# Altium footprint library RDM_ALT_PCB.PcbLib: 171 footprints (part 7 of 11)
Each footprint in its own frame and in the unit in brackets; x right, y up, seen from the top. Pads: shape width x height; smd on the part's side, far side on the other; paste and mask are expansions set on the pad; w line width, h text height; cw(c..) or ccw(c..) is an arc to the next point about the centre after c.
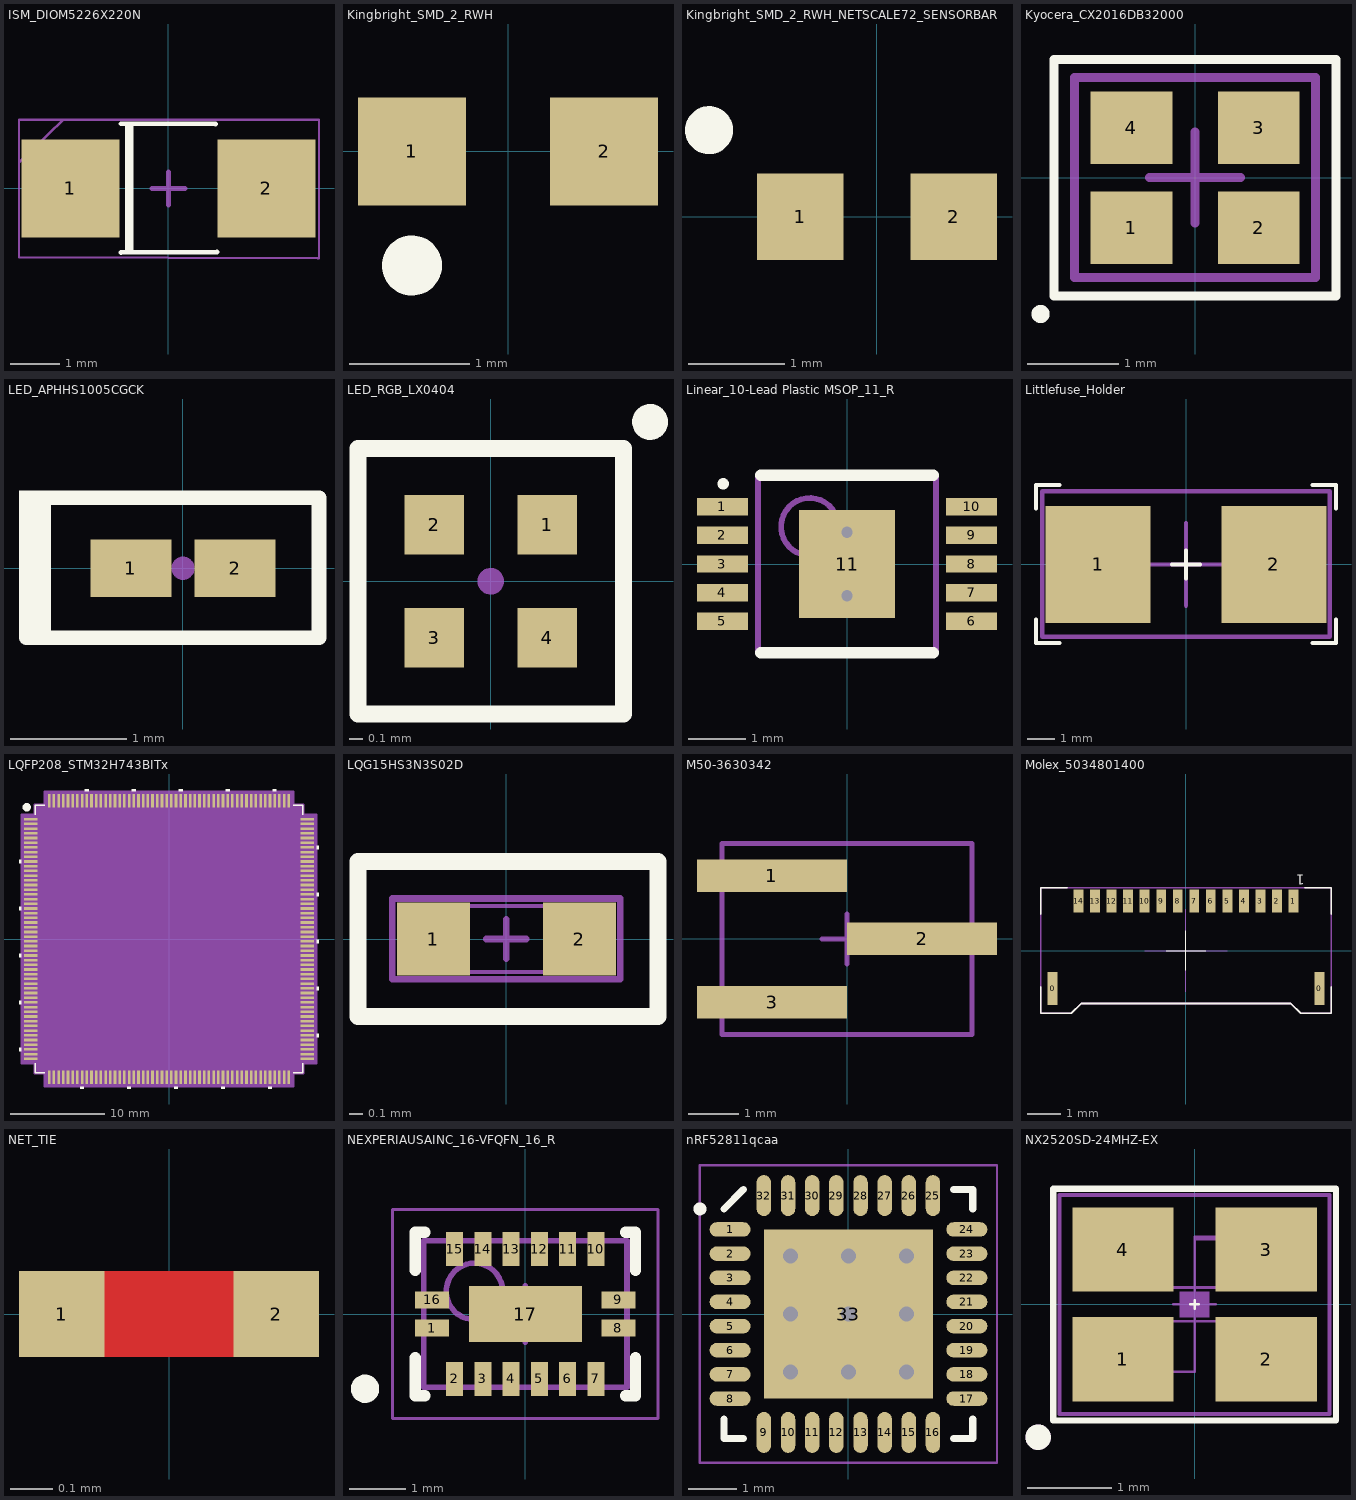
[diagram p6: the footprints below, top view; thin cyan lines are the x and y axes]

## ISM_DIOM5226X220N [mm]
pads (2):
  rect 2x2 smd: 1(-2,0) 2(2,0)
Top Overlay:
  rectangle: -0.889,-1.321 -0.711,1.321
  lines w0.1: -0.965,-1.309 0.991,-1.295 ; -0.965,1.321 0.965,1.314
Mechanical 13:
  lines w0.1: -0.337,0 0.337,0 ; 0,-0.337 0,0.337
Mechanical 15:
  lines w0.05: -3.05,-1.41 3.05,-1.425 ; -3.05,-1.4 -3.05,1.4 3.075,1.4 ; -3.041,0.541 -2.15,1.4 ; -0.337,0 0.337,0 ; 0,-0.337 0,0.337 ; 3.075,-1.425 3.075,1.375
3D body "1SMA5.0AT3G.stp": height 2.2, standoff 0, extent -2.605,-1.302 2.605,1.303

## Kingbright_SMD_2_RWH [mm] "Kingbright_SMD_2_RWH"
height 0.6
pads (2):
  rect 0.9x0.9 smd: 1(-0.8,0) 2(0.8,0)
Top Overlay:
  circle w0.25: c-0.8,-0.95 r0.125
3D body "APA1606.STEP": height 0.6, standoff 0, extent -0.801,-0.301 0.8,0.9

## Kingbright_SMD_2_RWH_NETSCALE72_SENSORBAR [mm] "Kingbright_SMD_2_RWH"
height 0.6
pads (2):
  rect 0.9x0.9 smd: 1(-0.8,0) 2(0.8,0)
Top Overlay:
  circle w0.25: c-1.75,0.9 r0.125
3D body "APA1606.STEP": height 0.6, standoff 0, extent -0.801,-0.301 0.8,0.9

## Kyocera_CX2016DB32000 [mm] "CRYSTAL 32.0000MHZ 8PF SMD"
pads (4):
  rect 0.9x0.8 smd: 1(-0.7,-0.55) 2(0.7,-0.55) 3(0.7,0.55) 4(-0.7,0.55)
Top Overlay:
  circle w0.1: c-1.7,-1.5 r0.05
  lines w0.1: -1.55,-1.3 1.55,-1.3 1.55,1.3 -1.55,1.3 -1.55,-1.3
Mechanical 13:
  lines w0.1: -1.325,-1.1 1.325,-1.1 1.325,1.1 -1.325,1.1 -1.325,-1.1
Mechanical 15:
  lines w0.05: -1.55,-1.3 1.55,-1.3 1.55,1.3 -1.55,1.3 -1.55,-1.3
  lines w0.1: -0.5,0 0.5,0 ; 0,-0.5 0,0.5
3D body: height 0.01, standoff -0.05, extent -1.05,-0.85 -0.475,-0.325
3D body: height 0.01, standoff -0.05, extent 0.475,-0.85 1.05,-0.317
3D body: height 0.01, standoff -0.05, extent 0.475,0.325 1.05,0.85
3D body: height 0.01, standoff -0.05, extent -1.05,0.325 -0.475,0.85
3D body: height 0.45, standoff 0, extent -1.15,-0.95 1.15,0.95
3D body: height 0.6, standoff -0.6, extent 0.375,-1.4 0.375,-1.4

## LED_APHHS1005CGCK [mm] "LED_CHIP_0402"
height 0.6
pads (2):
  rect 0.7x0.5 smd: 1(-0.45,0) 2(0.45,0)
Top Overlay:
  rectangle: -1.416,-0.6 -1.141,0.673
  lines w0.127: -1.351,-0.6 -1.351,0.61 1.175,0.61 1.175,-0.6 -1.351,-0.6
Mechanical 15:
  circle w0.1: c0,0 r0.05
  lines w0.1: -1.26,-0.6 -1.26,0.6 1.175,0.6 1.175,-0.6 -1.26,-0.6
3D body "User Library-LED_1006_G.STEP": height 0.2, standoff 0, extent -0.5,-0.3 0.5,0.3

## LED_RGB_LX0404 [mm] "LED RGB CLEAR SMD"
height 0.25
pads (4):
  rect 0.45x0.45 smd: 1(0.425,0.425) 2(-0.425,0.425) 3(-0.425,-0.425) 4(0.425,-0.425)
Top Overlay:
  circle w0.15: c1.2,1.2 r0.06
  lines w0.127: -1,-1 1,-1 1,1 -1,1 -1,-1
Mechanical 15:
  circle w0.1: c0,0 r0.05
  lines w0.1: -1,-1 -1,1 1,1 1,-1 -1,-1
3D body: height 0.26, standoff 0, extent -0.128,-0.333 0.128,0.333
3D body: height 0.25, standoff 0, extent -0.8,-0.8 0.8,0.8
3D body: height 0.26, standoff 0, extent 0.297,-0.333 0.553,0.333
3D body: height 0.26, standoff 0, extent -0.553,-0.333 -0.297,0.333

## Linear_10-Lead Plastic MSOP_11_R [mm] "Linear_10-Lead Plastic MSOP_11_R"
height 1.1
pads (11):
  rect 0.889x0.305 smd mask+0.082: 1(-2.171,1) 2(-2.171,0.5) 3(-2.171,0) 4(-2.171,-0.5) 5(-2.171,-1) 6(2.171,-1) 7(2.171,-0.5) 8(2.171,0) 9(2.171,0.5) 10(2.171,1)
  rect 1.68x1.88 smd mask+0.082: 11(0,0)
via 0,0.55 diameter 0.5 hole 0.2
via 0,-0.55 diameter 0.5 hole 0.2
Top Overlay:
  circle w0.2: c-2.159,1.397 r0
  lines w0.2: -1.5,-1.55 1.5,-1.55 ; -1.5,1.55 1.5,1.55
Mechanical 13:
  circle w0.1: c-0.65,0.65 r0.5
  lines w0.1: -1.55,-1.55 -1.55,1.55 1.55,1.55 1.55,-1.55 -1.55,-1.55
3D body: height 1.1, standoff 0.05, extent -1.55,-1.55 1.55,1.55

## Littlefuse_Holder [mm] "SMD  Fuse Board 375mA 125VAC/VDC"
pads (2):
  rect 3.81x4.24 smd: 1(-3.19,0) 2(3.19,0)
Top Overlay:
  lines w0.15: -5.446,-2.007 -5.446,-2.858 -4.595,-2.858 ; -5.446,2.034 -5.446,2.885 -4.595,2.885 ; -0.508,0 0.508,0 ; 0,-0.508 0,0.508 ; 4.595,-2.858 5.446,-2.858 5.446,-2.007 ; 4.595,2.885 5.446,2.885 5.446,2.034
Mechanical 15:
  lines w0.15: -1.5,0 1.5,0 ; 0,-1.5 0,1.5 ; -5.217,-2.629 5.217,-2.629 5.217,2.656 -5.217,2.656 -5.217,-2.629
3D body "Littlefuse_with_catridge_3D.STEP": height 3.81, standoff 0, extent -4.865,-2.515 4.865,2.515

## LQFP208_STM32H743BITx [mil]
pads (208):
  rect 58x11 smd: 1(-579.5,501.97) 2(-579.5,482.28) 3(-579.5,462.6) 4(-579.5,442.91) 5(-579.5,423.23) 6(-579.5,403.54) 7(-579.5,383.86) 8(-579.5,364.17) 9(-579.5,344.49) 10(-579.5,324.8) 11(-579.5,305.12) 12(-579.5,285.43) 13(-579.5,265.75) 14(-579.5,246.06) 15(-579.5,226.38) 16(-579.5,206.69) 17(-579.5,187.01) 18(-579.5,167.32) 19(-579.5,147.64) 20(-579.5,127.95) 21(-579.5,108.27) 22(-579.5,88.58) 23(-579.5,68.9) 24(-579.5,49.21) 25(-579.5,29.53) 26(-579.5,9.84) 27(-579.5,-9.84) 28(-579.5,-29.53) 29(-579.5,-49.21) 30(-579.5,-68.9) 31(-579.5,-88.58) 32(-579.5,-108.27) 33(-579.5,-127.95) 34(-579.5,-147.64) 35(-579.5,-167.32) 36(-579.5,-187.01) 37(-579.5,-206.69) 38(-579.5,-226.38) 39(-579.5,-246.06) 40(-579.5,-265.75) 41(-579.5,-285.43) 42(-579.5,-305.12) 43(-579.5,-324.8) 44(-579.5,-344.49) 45(-579.5,-364.17) 46(-579.5,-383.86) 47(-579.5,-403.54) 48(-579.5,-423.23) 49(-579.5,-442.91) 50(-579.5,-462.6) 51(-579.5,-482.28) 52(-579.5,-501.97) 105(579.5,-501.97) 106(579.5,-482.28) 107(579.5,-462.6) 108(579.5,-442.91) 109(579.5,-423.23) 110(579.5,-403.54) 111(579.5,-383.86) 112(579.5,-364.17) 113(579.5,-344.49) 114(579.5,-324.8) 115(579.5,-305.12) 116(579.5,-285.43) 117(579.5,-265.75) 118(579.5,-246.06) 119(579.5,-226.38) 120(579.5,-206.69) 121(579.5,-187.01) 122(579.5,-167.32) 123(579.5,-147.64) 124(579.5,-127.95) 125(579.5,-108.27) 126(579.5,-88.58) 127(579.5,-68.9) 128(579.5,-49.21) 129(579.5,-29.53) 130(579.5,-9.84) 131(579.5,9.84) 132(579.5,29.53) 133(579.5,49.21) 134(579.5,68.9) 135(579.5,88.58) 136(579.5,108.27) 137(579.5,127.95) 138(579.5,147.64) 139(579.5,167.32) 140(579.5,187.01) 141(579.5,206.69) 142(579.5,226.38) 143(579.5,246.06) 144(579.5,265.75) 145(579.5,285.43) 146(579.5,305.12) 147(579.5,324.8) 148(579.5,344.49) 149(579.5,364.17) 150(579.5,383.86) 151(579.5,403.54) 152(579.5,423.23) 153(579.5,442.91) 154(579.5,462.6) 155(579.5,482.28) 156(579.5,501.97)
  rect 11x58 smd: 53(-501.97,-579.5) 54(-482.28,-579.5) 55(-462.6,-579.5) 56(-442.91,-579.5) 57(-423.23,-579.5) 58(-403.54,-579.5) 59(-383.86,-579.5) 60(-364.17,-579.5) 61(-344.49,-579.5) 62(-324.8,-579.5) 63(-305.12,-579.5) 64(-285.43,-579.5) 65(-265.75,-579.5) 66(-246.06,-579.5) 67(-226.38,-579.5) 68(-206.69,-579.5) 69(-187.01,-579.5) 70(-167.32,-579.5) 71(-147.64,-579.5) 72(-127.95,-579.5) 73(-108.27,-579.5) 74(-88.58,-579.5) 75(-68.9,-579.5) 76(-49.21,-579.5) 77(-29.53,-579.5) 78(-9.84,-579.5) 79(9.84,-579.5) 80(29.53,-579.5) 81(49.21,-579.5) 82(68.9,-579.5) 83(88.58,-579.5) 84(108.27,-579.5) 85(127.95,-579.5) 86(147.64,-579.5) 87(167.32,-579.5) 88(187.01,-579.5) 89(206.69,-579.5) 90(226.38,-579.5) 91(246.06,-579.5) 92(265.75,-579.5) 93(285.43,-579.5) 94(305.12,-579.5) 95(324.8,-579.5) 96(344.49,-579.5) 97(364.17,-579.5) 98(383.86,-579.5) 99(403.54,-579.5) 100(423.23,-579.5) 101(442.91,-579.5) 102(462.6,-579.5) 103(482.28,-579.5) 104(501.97,-579.5) 157(501.97,579.5) 158(482.28,579.5) 159(462.6,579.5) 160(442.91,579.5) 161(423.23,579.5) 162(403.54,579.5) 163(383.86,579.5) 164(364.17,579.5) 165(344.49,579.5) 166(324.8,579.5) 167(305.12,579.5) 168(285.43,579.5) 169(265.75,579.5) 170(246.06,579.5) 171(226.38,579.5) 172(206.69,579.5) 173(187.01,579.5) 174(167.32,579.5) 175(147.64,579.5) 176(127.95,579.5) 177(108.27,579.5) 178(88.58,579.5) 179(68.9,579.5) 180(49.21,579.5) 181(29.53,579.5) 182(9.84,579.5) 183(-9.84,579.5) 184(-29.53,579.5) 185(-49.21,579.5) 186(-68.9,579.5) 187(-88.58,579.5) 188(-108.27,579.5) 189(-127.95,579.5) 190(-147.64,579.5) 191(-167.32,579.5) 192(-187.01,579.5) 193(-206.69,579.5) 194(-226.38,579.5) 195(-246.06,579.5) 196(-265.75,579.5) 197(-285.43,579.5) 198(-305.12,579.5) 199(-324.8,579.5) 200(-344.49,579.5) 201(-364.17,579.5) 202(-383.86,579.5) 203(-403.54,579.5) 204(-423.23,579.5) 205(-442.91,579.5) 206(-462.6,579.5) 207(-482.28,579.5) 208(-501.97,579.5)
Top Overlay:
  circle w19.68: c-596,552 r7.87
  region: -336.99,618.5 -351.99,618.5 -351.99,628.5 -336.99,628.5
  region: -140.14,618.5 -155.14,618.5 -155.14,628.5 -140.14,628.5
  region: 56.71,618.5 41.71,618.5 41.71,628.5 56.71,628.5
  region: 253.56,618.5 238.56,618.5 238.56,628.5 253.56,628.5
  region: 450.41,618.5 435.41,618.5 435.41,628.5 450.41,628.5
  region: 618.5,391.36 628.5,391.36 628.5,376.36 618.5,376.36
  region: 618.5,194.51 628.5,194.51 628.5,179.51 618.5,179.51
  region: 618.5,-2.34 628.5,-2.34 628.5,-17.34 618.5,-17.34
  region: 618.5,-199.19 628.5,-199.19 628.5,-214.19 618.5,-214.19
  region: 618.5,-396.04 628.5,-396.04 628.5,-411.04 618.5,-411.04
  region: 430.73,-618.5 415.73,-618.5 415.73,-628.5 430.73,-628.5
  region: 233.88,-618.5 218.88,-618.5 218.88,-628.5 233.88,-628.5
  region: 37.03,-618.5 22.03,-618.5 22.03,-628.5 37.03,-628.5
  region: -159.82,-618.5 -174.82,-618.5 -174.82,-628.5 -159.82,-628.5
  region: -356.67,-618.5 -371.67,-618.5 -371.67,-628.5 -356.67,-628.5
  region: -618.5,-455.1 -628.5,-455.1 -628.5,-470.1 -618.5,-470.1
  region: -618.5,-258.25 -628.5,-258.25 -628.5,-273.25 -618.5,-273.25
  region: -618.5,-61.4 -628.5,-61.4 -628.5,-76.4 -618.5,-76.4
  region: -618.5,135.45 -628.5,135.45 -628.5,120.45 -618.5,120.45
  region: -618.5,332.3 -628.5,332.3 -628.5,317.3 -618.5,317.3
  lines w6: -560,-520.57 -560,-560 -520.57,-560 ; -560,520.57 -560,560 -520.57,560 ; 520.57,-560 560,-560 560,-520.57 ; 520.57,560 560,560 560,520.57
Mechanical 13:
  region: -521.97,-565 -565,-565 -565,-521.97 -620,-521.97 -620,521.97 -565,521.97 -565,565 -521.97,565 -521.97,620 521.97,620 521.97,565 565,565 565,521.97 620,521.97 620,-521.97 565,-521.97 565,-565 521.97,-565 521.97,-620 -521.97,-620
  text "RefDes2" at 0,0 h50
  text "*" at -540,511.81 h50
Mechanical 15:
  lines w6: -620,-521.97 -620,521.97 -565,521.97 -565,565 -521.97,565 -521.97,620 521.97,620 521.97,565 565,565 565,521.97 620,521.97 620,-521.97 565,-521.97 565,-565 521.97,-565 521.97,-620 -521.97,-620 -521.97,-565 -565,-565 -565,-521.97 -620,-521.97
3D body "LQFP208_28x28X1P.stp": height 63.1, standoff 0, extent -594.5,-594.5 594.5,594.5

## LQG15HS3N3S02D [mm] "Murata Inductor"
pads (2):
  rect 0.55x0.55 smd: 1(-0.55,0) 2(0.55,0)
Top Overlay:
  lines w0.127: -1.118,-0.584 1.143,-0.584 1.143,0.584 -1.118,0.584 -1.118,-0.584
Mechanical 13:
  lines w0.03: -0.5,-0.25 0.5,-0.25 0.5,0.25 -0.5,0.25 -0.5,-0.25
  lines w0.05: -0.15,0 0.15,0 ; 0,-0.15 0,0.15 ; -0.859,-0.303 0.858,-0.303 0.858,0.305 -0.859,0.305 -0.859,-0.303
Mechanical 15:
  lines w0.03: -0.5,-0.25 0.5,-0.25 0.5,0.25 -0.5,0.25 -0.5,-0.25
  lines w0.05: -0.859,-0.304 0.858,-0.304 0.858,0.304 -0.859,0.304 -0.859,-0.304 ; -0.15,0 0.15,0 -0.15,0 ; 0,-0.15 0,0.15 0,-0.15
3D body "HK100515NJ-T.stp": height 0.55, standoff 0, extent -0.5,-0.25 0.5,0.25

## M50-3630342 [mm] "M50-3630342"
height 4.5
pads (3):
  rect 3x0.65 smd: 1(-1.5,1.27) 2(1.5,0) 3(-1.5,-1.27)
Mechanical 13:
  lines w0.1: -2.5,-1.906 -2.5,1.906 2.5,1.906 2.5,-1.906 -2.5,-1.906
Mechanical 15:
  lines w0.1: -0.5,0 0.5,0 ; 0,-0.5 0,0.5
3D body "M50-3630342.STEP": height 4.5, standoff 0, extent -2.5,-1.906 2.5,1.906

## Molex_5034801400 [mm] "CONN FPC 14POS 0.50MM Right Angle"
height 2.98
pads (16):
  rect 0.3x1 smd: 0(-4.04,-1.15) 0(4.04,-1.15)
  rect 0.3x0.7 smd: 1(3.25,1.5) 2(2.75,1.5) 3(2.25,1.5) 4(1.75,1.5) 5(1.25,1.5) 6(0.75,1.5) 7(0.25,1.5) 8(-0.25,1.5) 9(-0.75,1.5) 10(-1.25,1.5) 11(-1.75,1.5) 12(-2.25,1.5) 13(-2.75,1.5) 14(-3.25,1.5)
Top Overlay:
  lines w0.03: -0.6,0 0.6,0 ; 0,-0.6 0,0.6
  lines w0.05: -4.4,-1.9 -3.47,-1.9 -3.17,-1.6 3.17,-1.6 3.47,-1.9 4.4,-1.9 4.4,-1.1 ; -4.4,1.1 -4.4,1.9 -3.6,1.9 ; -4.399,-1.9 -4.399,-1.1 ; 3.6,1.9 4.4,1.9 4.4,1.1
  text "1" at 3.6,2.3 h0.3
Mechanical 13:
  lines w0.01: -1.25,0 1.25,0 ; 0,-1.25 0,1.25
  lines w0.05: -4.4,-1.9 -4.4,1.9 4.4,1.9 4.4,-1.9 3.47,-1.9 3.17,-1.6 -3.17,-1.6 -3.47,-1.9 -4.4,-1.9
Mechanical 15:
  lines w0.01: -1.25,0 1.25,0 ; 0,-1.25 0,1.25
3D body "5034801400.stp": height 1.89, standoff -0.01, extent -4.35,-1.85 4.35,1.75

## NET_TIE [mil] "Allows to short two different types of nets"
pads (2):
  rect 8x8 smd: 1(-10,0) 2(10,0)
Top Layer:
  lines w8: -10,0 10,0

## NEXPERIAUSAINC_16-VFQFN_16_R [mm]
pads (17):
  rect 0.6x0.3 smd paste-0.05 mask+0.08: 1(-1.65,-0.25) 8(1.65,-0.25) 9(1.65,0.25) 16(-1.65,0.25)
  rect 0.3x0.6 smd paste-0.05 mask+0.08: 2(-1.25,-1.15) 3(-0.75,-1.15) 4(-0.25,-1.15) 5(0.25,-1.15) 6(0.75,-1.15) 7(1.25,-1.15) 10(1.25,1.15) 11(0.75,1.15) 12(0.25,1.15) 13(-0.25,1.15) 14(-0.75,1.15) 15(-1.25,1.15)
  rect 2x1 smd: 17(0,0)
Top Overlay:
  circle w0.25: c-2.838,-1.324 r0.125
  lines w0.2: -1.95,-0.775 -1.95,-1.45 -1.775,-1.45 ; -1.95,0.775 -1.95,1.45 -1.775,1.45 ; 1.775,-1.45 1.95,-1.45 1.95,-0.775 ; 1.775,1.45 1.95,1.45 1.95,0.775
Mechanical 13:
  circle w0.1: c-0.9,0.4 r0.5
  lines w0.1: -1.8,-1.3 -1.8,1.3 1.8,1.3 1.8,-1.3 -1.8,-1.3
Mechanical 15:
  lines w0.05: -2.35,-1.85 -2.35,1.85 2.35,1.85 2.35,-1.85 -2.35,-1.85
  lines w0.1: -0.5,0 0.5,0 ; 0,-0.5 0,0.5
3D body "QFN50P350X250X100_HS-17N.step": height 1, standoff 0, extent -1.85,-1.35 1.85,1.35

## nRF52811qcaa [mm] "Nordic QFN 32"
pads (33):
  oval 0.85x0.3 smd mask+0.076: 1(-2.45,1.75) 2(-2.45,1.25) 3(-2.45,0.75) 4(-2.45,0.25) 5(-2.45,-0.25) 6(-2.45,-0.75) 7(-2.45,-1.25) 8(-2.45,-1.75) 17(2.45,-1.75) 18(2.45,-1.25) 19(2.45,-0.75) 20(2.45,-0.25) 21(2.45,0.25) 22(2.45,0.75) 23(2.45,1.25) 24(2.45,1.75)
  oval 0.3x0.85 smd mask+0.076: 9(-1.75,-2.45) 10(-1.25,-2.45) 11(-0.75,-2.45) 12(-0.25,-2.45) 13(0.25,-2.45) 14(0.75,-2.45) 15(1.25,-2.45) 16(1.75,-2.45) 25(1.75,2.45) 26(1.25,2.45) 27(0.75,2.45) 28(0.25,2.45) 29(-0.25,2.45) 30(-0.75,2.45) 31(-1.25,2.45) 32(-1.75,2.45)
  rect 3.5x3.5 smd: 33(0,0)
via 0,0 diameter 0.61 hole 0.305
via 0,1.2 diameter 0.61 hole 0.305
via -1.2,1.2 diameter 0.61 hole 0.305
via -1.2,0 diameter 0.61 hole 0.305
via -1.2,-1.2 diameter 0.61 hole 0.305
via 0,-1.2 diameter 0.61 hole 0.305
via 1.2,-1.2 diameter 0.61 hole 0.305
via 1.2,0 diameter 0.61 hole 0.305
via 1.2,1.2 diameter 0.61 hole 0.305
Top Overlay:
  circle w0.15: c-3.075,2.175 r0.06
  lines w0.15: -2.575,-2.175 -2.575,-2.575 -2.175,-2.575 ; -2.575,2.175 -2.175,2.575 ; 2.175,-2.575 2.575,-2.575 2.575,-2.175 ; 2.175,2.575 2.575,2.575 2.575,2.175
Mechanical 15:
  lines w0.05: -3.075,-3.075 3.075,-3.075 3.075,3.075 -3.075,3.075 -3.075,-3.075
  lines w0.1: -0.5,0 0.5,0 ; 0,-0.5 0,0.5
3D body "QFN50P500X500X90_HS-33N.step": height 0.9, standoff 0, extent -2.501,-2.501 2.501,2.501

## NX2520SD-24MHZ-EX [mm] "SMD Crystal, SMD; Body 3.2 x 2.5 mm (LxW max)"
height 0.8
pads (4):
  rect 1.2x1 smd: 1(-0.85,-0.65) 2(0.85,-0.65) 3(0.85,0.65) 4(-0.85,0.65)
Top Overlay:
  circle w0.25: c-1.854,-1.575 r0.025
  lines w0.03: -0.051,0 0.051,0 ; 0,-0.051 0,0.051
  lines w0.076: -1.676,-1.376 -1.676,1.372 1.676,1.372 1.676,-1.376 -1.676,-1.376
Mechanical 13:
  circle w0.25: c-1.854,-1.575 r0.025
  region: -0.175,0.15 0.175,0.15 0.175,-0.15 -0.175,-0.15
  lines w0.03: -0.25,-0.8 0,-0.8 0,-0.263 ; -0.25,0 0.25,0 ; -0.225,-0.2 0.225,-0.2 ; -0.225,0.2 0.225,0.2 ; 0,-0.25 0,0.25 ; 0,0.263 0,0.775 0.25,0.775
  lines w0.05: -1.6,-1.3 -1.6,1.295 1.6,1.295 1.6,-1.3 -1.6,-1.3
Mechanical 15:
  circle w0.25: c-1.854,-1.575 r0.025
  region: -0.175,0.15 0.175,0.15 0.175,-0.15 -0.175,-0.15
  lines w0.03: -0.475,-0.8 0,-0.8 0,-0.263 ; -0.313,-0.2 0.312,-0.2 ; -0.313,0.2 0.312,0.2 ; -0.25,0 0.25,0 ; 0,-0.25 0,0.25 ; 0,0.263 0,0.8 0.475,0.8
  lines w0.05: 1.6,-1.3 -1.6,-1.3 -1.6,1.295 1.6,1.295 1.6,-1.262
Multi-Layer:
  pour cut-out: -1.88,1.37
3D body "ECS-120-18-33-JGN-TR--3DModel-STEP-40055.STEP": height 0.81, standoff 0.01, extent -1.6,-1.3 1.6,1.2